# Altium footprint library B105connectors.PcbLib: 71 footprints (part 5 of 5)
Each footprint in its own frame and in the unit in brackets; x right, y up, seen from the top. Pads: shape width x height; smd on the part's side, far side on the other; paste and mask are expansions set on the pad; w line width, h text height; cw(c..) or ccw(c..) is an arc to the next point about the centre after c.
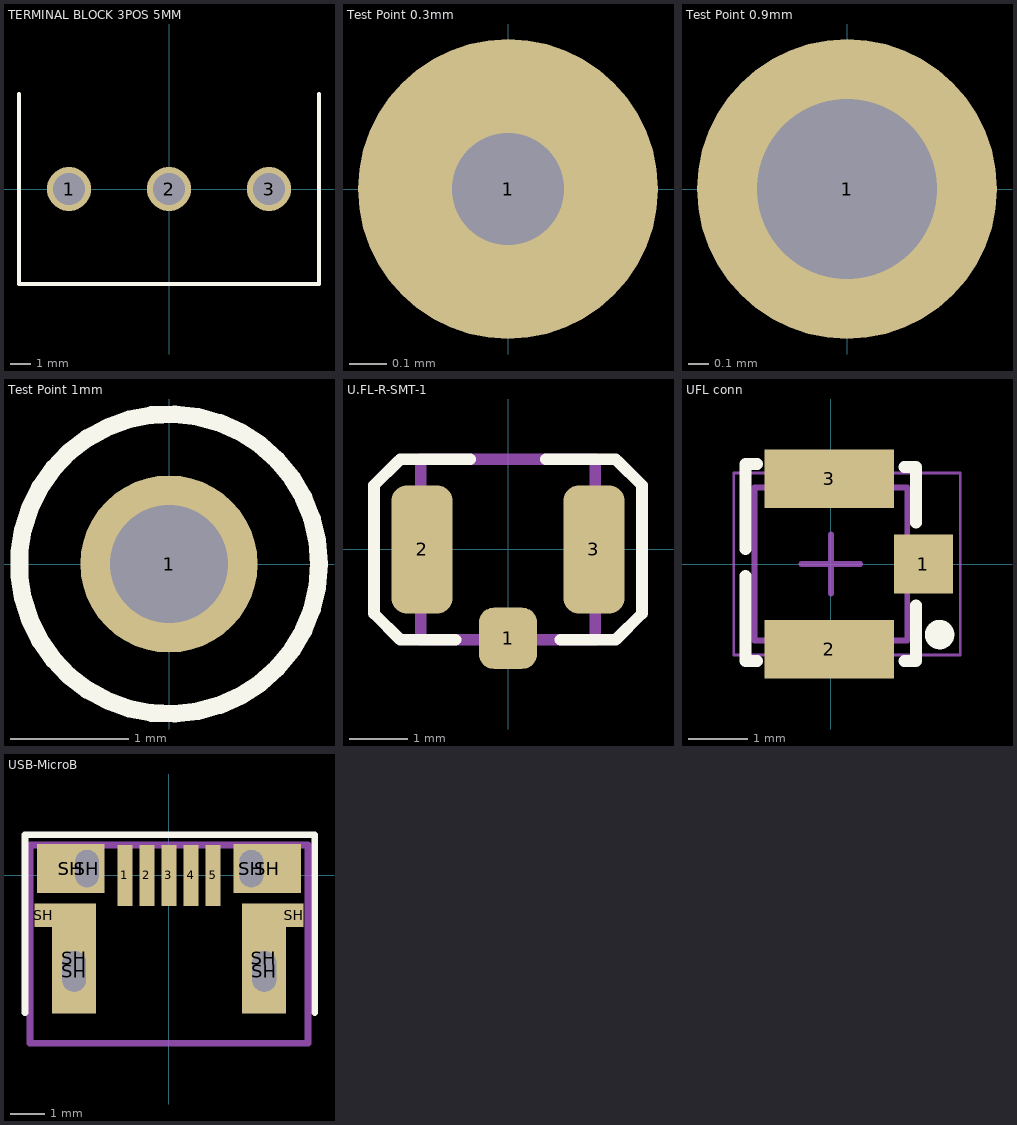
[diagram p4: the footprints below, top view; thin cyan lines are the x and y axes]

## TERMINAL BLOCK 3POS 5MM [mm] "Terminal Block, 3Pos, 5mm pitch"
height 15
pads (3):
  round 2.2 hole 1.6: 1(-5,0) 2(0,0) 3(5,0)
Top Overlay:
  lines w0.2: -7.5,4.75 -7.5,-4.75 7.5,-4.75 7.5,4.75
3D body "TerminalBlock-5mm-3pin.step": height 15.2, standoff -3.5, extent -7.5,-4.5 7.5,4.5

## Test Point 0.3mm [mm] "Diameter 0.8 mm; Hole size 0.3 mm"
pads (1):
  round 0.8 hole 0.3: 1(0,0)

## Test Point 0.9mm [mm] "Diameter 1.5 mm; Hole size 0.9 mm"
pads (1):
  round 1.5 hole 0.9: 1(0,0)

## Test Point 1mm [mm] "Diameter 1.5 mm; Hole size 1 mm"
height 4.6
pads (1):
  round 1.5 hole 1: 1(0,0)
Top Overlay:
  circle w0.15: c0,0 r1.27
3D body "Keystone_5002.stp": height 4.62, standoff -3, extent -1.245,-1.245 1.246,1.251

## U.FL-R-SMT-1 [mm] "UFL (Small Coax Connector)"
height 1.25
pads (3):
  rrect50% 1x1.05 smd: 1(0,-1.525)
  rrect50% 1.05x2.2 smd: 2(-1.475,0) 3(1.475,0)
Top Overlay:
  lines w0.2: -1.875,1.525 -2.3,1.1 -2.3,-1.1 -1.85,-1.55 -0.9,-1.55 ; -1.85,1.55 -0.65,1.55 ; 0.65,1.55 1.85,1.55 ; 0.9,-1.55 1.85,-1.55 2.3,-1.1 2.3,1.1 1.875,1.525
Mechanical 13:
  lines w0.2: -1.5,-1.55 -1.5,1.55 1.5,1.55 1.5,-1.55 -1.5,-1.55
3D body "U.FL-R-SMT-1.STEP": height 1.25, standoff -0.01, extent -1.5,-1.55 1.5,1.55

## UFL conn [mm] "UFL SMD connector"
height 1.1
pads (3):
  rect 1x1 smd: 1(1.575,0)
  rect 2.2x1 smd: 2(-0.025,-1.45) 3(-0.025,1.45)
Top Overlay:
  circle w0.25: c1.85,-1.2 r0.125
  lines w0.2: -1.45,-0.2 -1.45,-1.65 -1.25,-1.65 ; -1.45,0.25 -1.45,1.7 -1.25,1.7 ; 1.25,-1.65 1.45,-1.65 1.45,-0.7 ; 1.25,1.65 1.45,1.65 1.45,0.7
Mechanical 13:
  lines w0.1: -1.3,-1.3 1.3,-1.3 1.3,1.3 -1.3,1.3 -1.3,-1.3
Mechanical 15:
  lines w0.05: -1.65,-1.55 2.2,-1.55 2.2,1.55 -1.65,1.55 -1.65,-1.55
  lines w0.1: -0.5,0 0.5,0 ; 0,-0.5 0,0.5
3D body "SW3dPS-UFL-R-SMD.STEP": height 1.25, standoff 0, extent -1.55,-1.7 1.55,1.7

## USB-MicroB [mm]
pads (15):
  rect 0.45x1.8 smd: 1(-1.3,0) 2(-0.65,0) 3(0,0) 4(0.65,0) 5(1.3,0)
  rect 0.55x0.7 smd: SH(-3.7,-1.175) SH(3.7,-1.175)
  rect 2x1.45 smd: SH(-2.9,0.2) SH(2.9,0.2)
  oval 0.8x1.3 hole 0.7 slot 1.2 at 90 deg: SH(-2.8,-2.83) SH(2.81,-2.83)
  rect 1.3x3.25 smd: SH(-2.8,-2.45) SH(2.8,-2.45)
  oval 0.8x1.2 hole 0.7 slot 1.1 at 90 deg: SH(-2.42,0.2) SH(2.43,0.2)
Top Overlay:
  lines w0.2: -4.25,-4.05 -4.25,1.2 4.25,1.2 ; 4.3,-4.05 4.3,1.2
Mechanical 13:
  lines w0.2: -4.1,-4.95 4.1,-4.95 4.1,0.9 -4.1,0.9 -4.1,-4.95
3D body "MicroUSB-B_Molex_105017-0001.step": height 2.68, standoff -0.63, extent -4.1,-4.95 4.1,0.48